# Altium footprint library MYLIB.PcbLib: 600 footprints (part 16 of 39)
Each footprint in its own frame and in the unit in brackets; x right, y up, seen from the top. Pads: shape width x height; smd on the part's side, far side on the other; paste and mask are expansions set on the pad; w line width, h text height; cw(c..) or ccw(c..) is an arc to the next point about the centre after c.
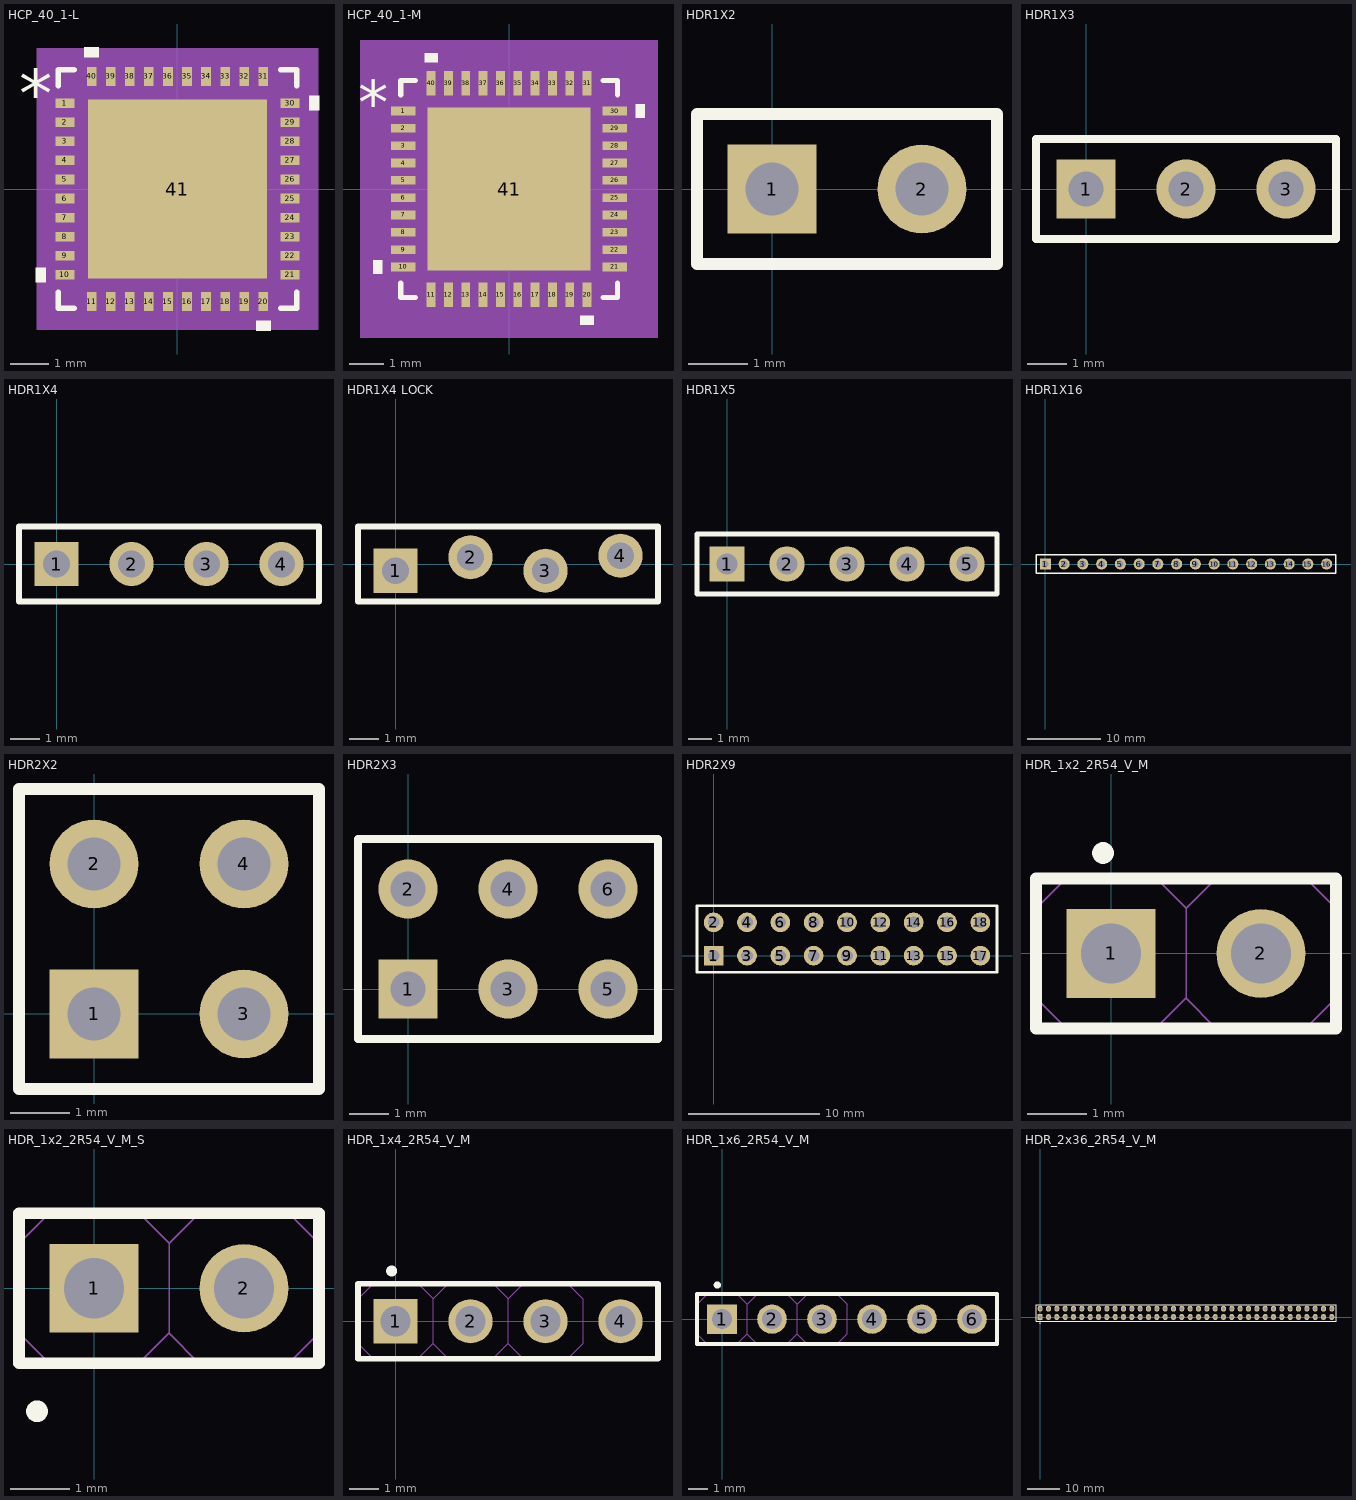
[diagram p15: the footprints below, top view; thin cyan lines are the x and y axes]

## HCP_40_1-L [mm]
pads (41):
  rect 0.503x0.254 smd paste+0 mask+0: 1(-2.952,2.25) 2(-2.952,1.75) 3(-2.952,1.25) 4(-2.952,0.75) 5(-2.952,0.25) 6(-2.952,-0.25) 7(-2.952,-0.75) 8(-2.952,-1.25) 9(-2.952,-1.75) 10(-2.952,-2.25) 21(2.952,-2.25) 22(2.952,-1.75) 23(2.952,-1.25) 24(2.952,-0.75) 25(2.952,-0.25) 26(2.952,0.25) 27(2.952,0.75) 28(2.952,1.25) 29(2.952,1.75) 30(2.952,2.25)
  rect 0.254x0.503 smd paste+0 mask+0: 11(-2.25,-2.952) 12(-1.75,-2.952) 13(-1.25,-2.952) 14(-0.75,-2.952) 15(-0.25,-2.952) 16(0.25,-2.952) 17(0.75,-2.952) 18(1.25,-2.952) 19(1.75,-2.952) 20(2.25,-2.952) 31(2.25,2.952) 32(1.75,2.952) 33(1.25,2.952) 34(0.75,2.952) 35(0.25,2.952) 36(-0.25,2.952) 37(-0.75,2.952) 38(-1.25,2.952) 39(-1.75,2.952) 40(-2.25,2.952)
  rect 4.7x4.7 smd paste-2.337 mask+0: 41(0,0)
Top Overlay:
  region: -3.457,-2.06 -3.711,-2.06 -3.711,-2.441 -3.457,-2.441
  region: 2.441,-3.457 2.06,-3.457 2.06,-3.711 2.441,-3.711
  region: 3.457,2.441 3.711,2.441 3.711,2.06 3.457,2.06
  region: -2.06,3.457 -2.441,3.457 -2.441,3.711 -2.06,3.711
  lines w0.152: -3.127,-2.71 -3.127,-3.127 -2.71,-3.127 ; -3.127,2.71 -3.127,3.127 -2.71,3.127 ; 2.71,-3.127 3.127,-3.127 3.127,-2.71 ; 2.71,3.127 3.127,3.127 3.127,2.71
  text "*" at -4.156,1.865 h1.27
Top Paste:
  region: -0.883,2.25 -2.25,2.25 -2.25,0.883 -0.883,0.883
  region: -0.883,0.683 -2.25,0.683 -2.25,-0.683 -0.883,-0.683
  region: -0.883,-0.883 -2.25,-0.883 -2.25,-2.25 -0.883,-2.25
  region: 0.683,2.25 -0.683,2.25 -0.683,0.883 0.683,0.883
  region: 0.683,0.683 -0.683,0.683 -0.683,-0.683 0.683,-0.683
  region: 0.683,-0.883 -0.683,-0.883 -0.683,-2.25 0.683,-2.25
  region: 2.25,2.25 0.883,2.25 0.883,0.883 2.25,0.883
  region: 2.25,0.683 0.883,0.683 0.883,-0.683 2.25,-0.683
  region: 2.25,-0.883 0.883,-0.883 0.883,-2.25 2.25,-2.25
Mechanical 5:
  region: 3.686,-3.686 -3.686,-3.686 -3.686,3.686 3.686,3.686
Mechanical 13:
  lines w0.025: -3,1.73 -1.73,3 ; -3,-3 3,-3 3,3 -3,3 -3,-3 ; -3,-2.402 -3,-2.098 -3,-2.402 ; -3,-1.902 -3,-1.598 -3,-1.902 ; -3,-1.402 -3,-1.098 -3,-1.402 ; -3,-0.902 -3,-0.598 -3,-0.902 ; -3,-0.402 -3,-0.098 -3,-0.402 ; -3,0.098 -3,0.402 -3,0.098 ; -3,0.598 -3,0.902 -3,0.598 ; -3,1.098 -3,1.402 -3,1.098 ; -3,1.598 -3,1.902 -3,1.598 ; -3,2.098 -3,2.402 -3,2.098 ; -2.402,-3 -2.098,-3 -2.402,-3 ; -2.402,3 -2.098,3 -2.402,3 ; -1.902,-3 -1.598,-3 -1.902,-3 ; -1.902,3 -1.598,3 -1.902,3 ; -1.402,-3 -1.098,-3 -1.402,-3 ; -1.402,3 -1.098,3 -1.402,3 ; -0.902,-3 -0.598,-3 -0.902,-3 ; -0.902,3 -0.598,3 -0.902,3 ; -0.402,-3 -0.098,-3 -0.402,-3 ; -0.402,3 -0.098,3 -0.402,3 ; 0.098,-3 0.402,-3 0.098,-3 ; 0.098,3 0.402,3 0.098,3 ; 0.598,-3 0.902,-3 0.598,-3 ; 0.598,3 0.902,3 0.598,3 ; 1.098,-3 1.402,-3 1.098,-3 ; 1.098,3 1.402,3 1.098,3 ; 1.598,-3 1.902,-3 1.598,-3 ; 1.598,3 1.902,3 1.598,3 ; 2.098,-3 2.402,-3 2.098,-3 ; 2.098,3 2.402,3 2.098,3 ; 3,-2.402 3,-2.098 3,-2.402 ; 3,-1.902 3,-1.598 3,-1.902 ; 3,-1.402 3,-1.098 3,-1.402 ; 3,-0.902 3,-0.598 3,-0.902 ; 3,-0.402 3,-0.098 3,-0.402 ; 3,0.098 3,0.402 3,0.098 ; 3,0.598 3,0.902 3,0.598 ; 3,1.098 3,1.402 3,1.098 ; 3,1.598 3,1.902 3,1.598 ; 3,2.098 3,2.402 3,2.098
  text "*" at -3.017,1.865 h1.27
Mechanical 15:
  region: -2.479,-3.102 -3.102,-3.102 -3.102,-2.479 -3.305,-2.479 -3.305,2.479 -3.102,2.479 -3.102,3.102 -2.479,3.102 -2.479,3.305 2.479,3.305 2.479,3.102 3.102,3.102 3.102,2.479 3.305,2.479 3.305,-2.479 3.102,-2.479 3.102,-3.102 2.479,-3.102 2.479,-3.305 -2.479,-3.305
  lines w0.152: -3.305,-2.479 -3.102,-2.479 -3.102,-3.102 -2.479,-3.102 -2.479,-3.305 2.479,-3.305 2.479,-3.102 3.102,-3.102 3.102,-2.479 3.305,-2.479 3.305,2.479 3.102,2.479 3.102,3.102 2.479,3.102 2.479,3.305 -2.479,3.305 -2.479,3.102 -3.102,3.102 -3.102,2.479 -3.305,2.479 -3.305,-2.479
3D body: height 0.25, standoff 0, extent 0,0 0.254,0.254

## HCP_40_1-M [mm]
pads (41):
  rect 0.706x0.254 smd paste+0 mask+0: 1(-3.053,2.25) 2(-3.053,1.75) 3(-3.053,1.25) 4(-3.053,0.75) 5(-3.053,0.25) 6(-3.053,-0.25) 7(-3.053,-0.75) 8(-3.053,-1.25) 9(-3.053,-1.75) 10(-3.053,-2.25) 21(3.053,-2.25) 22(3.053,-1.75) 23(3.053,-1.25) 24(3.053,-0.75) 25(3.053,-0.25) 26(3.053,0.25) 27(3.053,0.75) 28(3.053,1.25) 29(3.053,1.75) 30(3.053,2.25)
  rect 0.254x0.706 smd paste+0 mask+0: 11(-2.25,-3.053) 12(-1.75,-3.053) 13(-1.25,-3.053) 14(-0.75,-3.053) 15(-0.25,-3.053) 16(0.25,-3.053) 17(0.75,-3.053) 18(1.25,-3.053) 19(1.75,-3.053) 20(2.25,-3.053) 31(2.25,3.053) 32(1.75,3.053) 33(1.25,3.053) 34(0.75,3.053) 35(0.25,3.053) 36(-0.25,3.053) 37(-0.75,3.053) 38(-1.25,3.053) 39(-1.75,3.053) 40(-2.25,3.053)
  rect 4.7x4.7 smd paste-2.337 mask+0: 41(0,0)
Top Overlay:
  region: -3.66,-2.06 -3.914,-2.06 -3.914,-2.441 -3.66,-2.441
  region: 2.441,-3.66 2.06,-3.66 2.06,-3.914 2.441,-3.914
  region: 3.66,2.441 3.914,2.441 3.914,2.06 3.66,2.06
  region: -2.06,3.66 -2.441,3.66 -2.441,3.914 -2.06,3.914
  lines w0.152: -3.127,-2.71 -3.127,-3.127 -2.71,-3.127 ; -3.127,2.71 -3.127,3.127 -2.71,3.127 ; 2.71,-3.127 3.127,-3.127 3.127,-2.71 ; 2.71,3.127 3.127,3.127 3.127,2.71
  text "*" at -4.359,1.865 h1.27
Top Paste:
  region: -0.883,2.25 -2.25,2.25 -2.25,0.883 -0.883,0.883
  region: -0.883,0.683 -2.25,0.683 -2.25,-0.683 -0.883,-0.683
  region: -0.883,-0.883 -2.25,-0.883 -2.25,-2.25 -0.883,-2.25
  region: 0.683,2.25 -0.683,2.25 -0.683,0.883 0.683,0.883
  region: 0.683,0.683 -0.683,0.683 -0.683,-0.683 0.683,-0.683
  region: 0.683,-0.883 -0.683,-0.883 -0.683,-2.25 0.683,-2.25
  region: 2.25,2.25 0.883,2.25 0.883,0.883 2.25,0.883
  region: 2.25,0.683 0.883,0.683 0.883,-0.683 2.25,-0.683
  region: 2.25,-0.883 0.883,-0.883 0.883,-2.25 2.25,-2.25
Mechanical 5:
  region: 4.295,-4.295 -4.295,-4.295 -4.295,4.295 4.295,4.295
Mechanical 13:
  lines w0.025: -3,1.73 -1.73,3 ; -3,-3 3,-3 3,3 -3,3 -3,-3 ; -3,-2.402 -3,-2.098 -3,-2.402 ; -3,-1.902 -3,-1.598 -3,-1.902 ; -3,-1.402 -3,-1.098 -3,-1.402 ; -3,-0.902 -3,-0.598 -3,-0.902 ; -3,-0.402 -3,-0.098 -3,-0.402 ; -3,0.098 -3,0.402 -3,0.098 ; -3,0.598 -3,0.902 -3,0.598 ; -3,1.098 -3,1.402 -3,1.098 ; -3,1.598 -3,1.902 -3,1.598 ; -3,2.098 -3,2.402 -3,2.098 ; -2.402,-3 -2.098,-3 -2.402,-3 ; -2.402,3 -2.098,3 -2.402,3 ; -1.902,-3 -1.598,-3 -1.902,-3 ; -1.902,3 -1.598,3 -1.902,3 ; -1.402,-3 -1.098,-3 -1.402,-3 ; -1.402,3 -1.098,3 -1.402,3 ; -0.902,-3 -0.598,-3 -0.902,-3 ; -0.902,3 -0.598,3 -0.902,3 ; -0.402,-3 -0.098,-3 -0.402,-3 ; -0.402,3 -0.098,3 -0.402,3 ; 0.098,-3 0.402,-3 0.098,-3 ; 0.098,3 0.402,3 0.098,3 ; 0.598,-3 0.902,-3 0.598,-3 ; 0.598,3 0.902,3 0.598,3 ; 1.098,-3 1.402,-3 1.098,-3 ; 1.098,3 1.402,3 1.098,3 ; 1.598,-3 1.902,-3 1.598,-3 ; 1.598,3 1.902,3 1.598,3 ; 2.098,-3 2.402,-3 2.098,-3 ; 2.098,3 2.402,3 2.098,3 ; 3,-2.402 3,-2.098 3,-2.402 ; 3,-1.902 3,-1.598 3,-1.902 ; 3,-1.402 3,-1.098 3,-1.402 ; 3,-0.902 3,-0.598 3,-0.902 ; 3,-0.402 3,-0.098 3,-0.402 ; 3,0.098 3,0.402 3,0.098 ; 3,0.598 3,0.902 3,0.598 ; 3,1.098 3,1.402 3,1.098 ; 3,1.598 3,1.902 3,1.598 ; 3,2.098 3,2.402 3,2.098
  text "*" at -3.017,1.865 h1.27
Mechanical 15:
  region: -2.885,-3.508 -3.508,-3.508 -3.508,-2.885 -3.914,-2.885 -3.914,2.885 -3.508,2.885 -3.508,3.508 -2.885,3.508 -2.885,3.914 2.885,3.914 2.885,3.508 3.508,3.508 3.508,2.885 3.914,2.885 3.914,-2.885 3.508,-2.885 3.508,-3.508 2.885,-3.508 2.885,-3.914 -2.885,-3.914
  lines w0.152: -3.914,-2.885 -3.508,-2.885 -3.508,-3.508 -2.885,-3.508 -2.885,-3.914 2.885,-3.914 2.885,-3.508 3.508,-3.508 3.508,-2.885 3.914,-2.885 3.914,2.885 3.508,2.885 3.508,3.508 2.885,3.508 2.885,3.914 -2.885,3.914 -2.885,3.508 -3.508,3.508 -3.508,2.885 -3.914,2.885 -3.914,-2.885
3D body: height 0.25, standoff 0, extent 0,0 0.254,0.254

## HDR1X2 [mm]
pads (2):
  rect 1.5x1.5 hole 0.9: 1(0,0)
  round 1.5 hole 0.9: 2(2.54,0)
Top Overlay:
  lines w0.2: -1.27,-1.27 3.81,-1.27 3.81,1.27 -1.27,1.27 -1.27,-1.27

## HDR1X3 [mm]
pads (3):
  rect 1.5x1.5 hole 0.9: 1(0,0)
  round 1.5 hole 0.9: 2(2.54,0) 3(5.08,0)
Top Overlay:
  lines w0.2: -1.27,-1.27 -1.27,1.27 6.35,1.27 6.35,-1.27 -1.27,-1.27

## HDR1X4 [mm]
pads (4):
  rect 1.5x1.5 hole 0.9: 1(0,0)
  round 1.5 hole 0.9: 2(2.54,0) 3(5.08,0) 4(7.62,0)
Top Overlay:
  lines w0.2: -1.27,-1.27 8.89,-1.27 8.89,1.27 -1.27,1.27 -1.27,-1.27

## HDR1X4 LOCK [mm]
pads (4):
  rect 1.5x1.5 hole 0.9: 1(0,-0.229)
  round 1.5 hole 0.9: 2(2.54,0.229) 3(5.08,-0.229) 4(7.62,0.279)
Top Overlay:
  lines w0.2: -1.27,-1.27 -1.27,1.27 8.89,1.27 8.89,-1.27 -1.27,-1.27

## HDR1X5 [mm]
pads (5):
  rect 1.5x1.5 hole 0.9: 1(0,0)
  round 1.5 hole 0.9: 2(2.54,0) 3(5.08,0) 4(7.62,0) 5(10.16,0)
Top Overlay:
  lines w0.2: -1.27,-1.27 -1.27,1.27 11.43,1.27 11.43,-1.27 -1.27,-1.27

## HDR1X16 [mm]
pads (16):
  rect 1.5x1.5 hole 0.9: 1(0,0)
  round 1.5 hole 0.9: 2(2.54,0) 3(5.08,0) 4(7.62,0) 5(10.16,0) 6(12.7,0) 7(15.24,0) 8(17.78,0) 9(20.32,0) 10(22.86,0) 11(25.4,0) 12(27.94,0) 13(30.48,0) 14(33.02,0) 15(35.56,0) 16(38.1,0)
Top Overlay:
  lines w0.2: -1.27,-1.27 -1.27,1.27 0.635,1.27 39.37,1.27 39.37,-1.27 -1.27,-1.27

## HDR2X2 [mm]
pads (4):
  rect 1.5x1.5 hole 0.9: 1(0,0)
  round 1.5 hole 0.9: 2(0,2.54) 3(2.54,0) 4(2.54,2.54)
Top Overlay:
  lines w0.2: -1.27,-1.27 -1.27,3.81 3.81,3.81 3.81,-1.27 -1.27,-1.27

## HDR2X3 [mm]
pads (6):
  rect 1.5x1.5 hole 0.9: 1(0,0)
  round 1.5 hole 0.9: 2(0,2.54) 3(2.54,0) 4(2.54,2.54) 5(5.08,0) 6(5.08,2.54)
Top Overlay:
  lines w0.2: 1.482,-1.27 6.35,-1.27 ; 6.35,-1.27 -1.27,-1.27 -1.27,3.81 6.35,3.81 6.35,-1.27

## HDR2X9 [mm]
pads (18):
  rect 1.5x1.5 hole 0.9: 1(0,0)
  round 1.5 hole 0.9: 2(0,2.54) 3(2.54,0) 4(2.54,2.54) 5(5.08,0) 6(5.08,2.54) 7(7.62,0) 8(7.62,2.54) 9(10.16,0) 10(10.16,2.54) 11(12.7,0) 12(12.7,2.54) 13(15.24,0) 14(15.24,2.54) 15(17.78,0) 16(17.78,2.54) 17(20.32,0) 18(20.32,2.54)
Top Overlay:
  lines w0.2: -1.27,-1.27 21.59,-1.27 21.59,3.81 -1.27,3.81 -1.27,-1.27

## HDR_1x2_2R54_V_M [mm] "Male Header, Pitch 2.54mm, 4x1 Position, Mated Height 6mm, Tail Length 3mm"
height 6
pads (2):
  rect 1.5x1.5 hole 1.02: 1(0,0)
  round 1.5 hole 1.02: 2(2.54,0)
Top Overlay:
  circle w0.25: c-0.135,1.702 r0.059
  lines w0.2: -1.27,-1.27 -1.27,1.27 3.81,1.27 3.81,-1.27 -1.27,-1.27
Mechanical 13:
  lines w0.025: 3.81,-0.762 3.302,-1.27 ; 3.81,0.762 3.302,1.27 1.778,1.27 1.27,0.762 ; -1.27,-0.762 -1.27,0.762 ; -1.27,-0.762 -1.27,0.762 ; -1.27,-0.762 -0.762,-1.27 ; -1.27,0.762 -0.762,1.27 0.762,1.27 1.27,0.762 ; -0.762,-1.27 0.762,-1.27 ; -0.762,-1.27 0.762,-1.27 ; 0.762,-1.27 1.27,-0.762 ; 1.27,-0.762 1.27,0.762 ; 1.27,-0.762 1.27,0.762 ; 1.27,-0.762 1.27,0.762 ; 1.27,-0.762 1.27,0.762 ; 1.27,-0.762 1.778,-1.27 ; 1.778,-1.27 3.302,-1.27 ; 1.778,-1.27 3.302,-1.27
3D body: height 2.54, standoff 0, extent -1.27,-1.27 1.27,1.27
3D body: height 9, standoff -10, extent -0.35,-0.349 0.347,0.349
3D body: height 2.54, standoff 0, extent 1.27,-1.27 3.81,1.27
3D body: height 9, standoff -10, extent 2.19,-0.349 2.887,0.349

## HDR_1x2_2R54_V_M_S [mm] "Male Header, Pitch 2.54mm, 4x1 Position, Mated Height 6mm, Tail Length 3mm"
height 6
pads (2):
  rect 1.5x1.5 hole 1.02: 1(0,0)
  round 1.5 hole 1.02: 2(2.54,0)
Top Overlay:
  circle w0.25: c-0.965,-2.083 r0.059
  lines w0.2: -1.27,-1.27 3.81,-1.27 3.81,1.27 -1.27,1.27 -1.27,-1.27
Mechanical 13:
  lines w0.025: 3.81,-0.762 3.302,-1.27 ; 3.81,0.762 3.302,1.27 1.778,1.27 1.27,0.762 ; -1.27,-0.762 -0.762,-1.27 ; -1.27,-0.762 -1.27,0.762 ; -1.27,-0.762 -1.27,0.762 ; -1.27,0.762 -0.762,1.27 0.762,1.27 1.27,0.762 ; -0.762,-1.27 0.762,-1.27 ; -0.762,-1.27 0.762,-1.27 ; 0.762,-1.27 1.27,-0.762 ; 1.27,-0.762 1.778,-1.27 ; 1.27,-0.762 1.27,0.762 ; 1.27,-0.762 1.27,0.762 ; 1.27,-0.762 1.27,0.762 ; 1.27,-0.762 1.27,0.762 ; 1.778,-1.27 3.302,-1.27 ; 1.778,-1.27 3.302,-1.27
3D body: height 9, standoff -3, extent 2.19,-0.349 2.887,0.349
3D body: height 2.54, standoff 0, extent 1.27,-1.27 3.81,1.27
3D body: height 9, standoff -3, extent -0.35,-0.349 0.347,0.349
3D body: height 2.54, standoff 0, extent -1.27,-1.27 1.27,1.27

## HDR_1x4_2R54_V_M [mm] "Male Header, Pitch 2.54mm, 4x1 Position, Mated Height 6mm, Tail Length 3mm"
height 6
pads (4):
  rect 1.5x1.5 hole 1.02: 1(0,0)
  round 1.5 hole 1.02: 2(2.54,0) 3(5.08,0) 4(7.62,0)
Top Overlay:
  circle w0.25: c-0.135,1.702 r0.059
  lines w0.2: 8.865,1.27 -1.27,1.27 -1.27,-1.27 8.89,-1.27 8.89,1.27
Mechanical 13:
  lines w0.025: -1.27,-0.762 -0.762,-1.27 ; -1.27,-0.762 -1.27,0.762 ; -1.27,-0.762 -1.27,0.762 ; -1.27,0.762 -0.762,1.27 0.762,1.27 1.27,0.762 ; -0.762,-1.27 0.762,-1.27 ; -0.762,-1.27 0.762,-1.27 ; 0.762,-1.27 1.27,-0.762 ; 1.27,-0.762 1.778,-1.27 ; 1.27,-0.762 1.27,0.762 ; 1.27,-0.762 1.27,0.762 ; 1.27,-0.762 1.27,0.762 ; 1.27,-0.762 1.27,0.762 ; 1.27,0.762 1.778,1.27 3.302,1.27 3.81,0.762 ; 1.778,-1.27 3.302,-1.27 ; 1.778,-1.27 3.302,-1.27 ; 3.302,-1.27 3.81,-0.762 ; 3.81,-0.762 4.318,-1.27 ; 3.81,-0.762 3.81,0.762 ; 3.81,-0.762 3.81,0.762 ; 3.81,-0.762 3.81,0.762 ; 3.81,-0.762 3.81,0.762 ; 3.81,0.762 4.318,1.27 5.842,1.27 6.35,0.762 ; 4.318,-1.27 5.842,-1.27 ; 4.318,-1.27 5.842,-1.27 ; 5.842,-1.27 6.35,-0.762 ; 6.35,-0.762 6.35,0.762 ; 6.35,-0.762 6.35,0.762
3D body: height 2.54, standoff 0, extent 6.35,-1.27 8.89,1.27
3D body: height 9, standoff -2.54, extent 7.27,-0.349 7.967,0.349
3D body: height 9, standoff -2.54, extent 4.73,-0.349 5.427,0.349
3D body: height 2.54, standoff 0, extent 3.81,-1.27 6.35,1.27
3D body: height 9, standoff -2.54, extent 2.19,-0.349 2.887,0.349
3D body: height 2.54, standoff 0, extent 1.27,-1.27 3.81,1.27
3D body: height 9, standoff -2.54, extent -0.35,-0.349 0.347,0.349
3D body: height 2.54, standoff 0, extent -1.27,-1.27 1.27,1.27

## HDR_1x6_2R54_V_M [mm] "Male Header, Pitch 2.54mm, 6x1 Position, Mated Height 6mm, Tail Length 3mm"
height 6
pads (6):
  rect 1.5x1.5 hole 1.02: 1(0,0)
  round 1.5 hole 1.02: 2(2.54,0) 3(5.08,0) 4(7.62,0) 5(10.16,0) 6(12.7,0)
Top Overlay:
  circle w0.25: c-0.236,1.727 r0.059
  lines w0.2: 13.945,-1.27 -1.27,-1.27 -1.27,1.27 13.945,1.27 ; 13.97,-1.27 13.97,1.27
Mechanical 13:
  lines w0.025: -1.27,-0.762 -0.762,-1.27 ; -1.27,-0.762 -1.27,0.762 ; -1.27,-0.762 -1.27,0.762 ; -1.27,0.762 -0.762,1.27 0.762,1.27 1.27,0.762 ; -0.762,-1.27 0.762,-1.27 ; -0.762,-1.27 0.762,-1.27 ; 0.762,-1.27 1.27,-0.762 ; 1.27,-0.762 1.778,-1.27 ; 1.27,-0.762 1.27,0.762 ; 1.27,-0.762 1.27,0.762 ; 1.27,-0.762 1.27,0.762 ; 1.27,-0.762 1.27,0.762 ; 1.27,0.762 1.778,1.27 3.302,1.27 3.81,0.762 ; 1.778,-1.27 3.302,-1.27 ; 1.778,-1.27 3.302,-1.27 ; 3.302,-1.27 3.81,-0.762 ; 3.81,-0.762 4.318,-1.27 ; 3.81,-0.762 3.81,0.762 ; 3.81,-0.762 3.81,0.762 ; 3.81,-0.762 3.81,0.762 ; 3.81,-0.762 3.81,0.762 ; 3.81,0.762 4.318,1.27 5.842,1.27 6.35,0.762 ; 4.318,-1.27 5.842,-1.27 ; 4.318,-1.27 5.842,-1.27 ; 5.842,-1.27 6.35,-0.762 ; 6.35,-0.762 6.35,0.762 ; 6.35,-0.762 6.35,0.762
3D body: height 2.54, standoff 0, extent 11.43,-1.27 13.97,1.27
3D body: height 9, standoff -2.54, extent 12.35,-0.349 13.047,0.349
3D body: height 2.54, standoff 0, extent 8.89,-1.27 11.43,1.27
3D body: height 9, standoff -2.54, extent 9.81,-0.349 10.507,0.349
3D body: height 2.54, standoff 0, extent 6.35,-1.27 8.89,1.27
3D body: height 9, standoff -2.54, extent 7.27,-0.349 7.967,0.349
3D body: height 9, standoff -2.54, extent 4.73,-0.349 5.427,0.349
3D body: height 2.54, standoff 0, extent 3.81,-1.27 6.35,1.27
3D body: height 9, standoff -2.54, extent 2.19,-0.349 2.887,0.349
3D body: height 2.54, standoff 0, extent 1.27,-1.27 3.81,1.27
3D body: height 9, standoff -2.54, extent -0.35,-0.349 0.347,0.349
3D body: height 2.54, standoff 0, extent -1.27,-1.27 1.27,1.27

## HDR_2x36_2R54_V_M [mm] "Male Header, Pitch 2.54mm, 36x2 Position, Mated Height 6mm, Tail Length 3mm"
height 6
pads (72):
  rect 1.5x1.8 hole 1.02: 1(0,0)
  oval 1.5x1.8 hole 1.02: 2(0,2.54) 3(2.54,0) 4(2.54,2.54) 5(5.08,0) 6(5.08,2.54) 7(7.62,0) 8(7.62,2.54) 9(10.16,0) 10(10.16,2.54) 11(12.7,0) 12(12.7,2.54) 13(15.24,0) 14(15.24,2.54) 15(17.78,0) 16(17.78,2.54) 17(20.32,0) 18(20.32,2.54) 19(22.86,0) 20(22.86,2.54) 21(25.4,0) 22(25.4,2.54) 23(27.94,0) 24(27.94,2.54) 25(30.48,0) 26(30.48,2.54) 27(33.02,0) 28(33.02,2.54) 29(35.56,0) 30(35.56,2.54) 31(38.1,0) 32(38.1,2.54) 33(40.64,0) 34(40.64,2.54) 35(43.18,0) 36(43.18,2.54) 37(45.72,0) 38(45.72,2.54) 39(48.26,0) 40(48.26,2.54) 41(50.8,0) 42(50.8,2.54) 43(53.34,0) 44(53.34,2.54) 45(55.88,0) 46(55.88,2.54) 47(58.42,0) 48(58.42,2.54) 49(60.96,0) 50(60.96,2.54) 51(63.5,0) 52(63.5,2.54) 53(66.04,0) 54(66.04,2.54) 55(68.58,0) 56(68.58,2.54) 57(71.12,0) 58(71.12,2.54) 59(73.66,0) 60(73.66,2.54) 61(76.2,0) 62(76.2,2.54) 63(78.74,0) 64(78.74,2.54) 65(81.28,0) 66(81.28,2.54) 67(83.82,0) 68(83.82,2.54) 69(86.36,0) 70(86.36,2.54) 71(88.9,0) 72(88.9,2.54)
Top Overlay:
  circle w0.25: c-0.059,-1.905 r0.059
  lines w0.127: -1.27,-1.27 -1.27,3.81 90.17,3.81 90.17,-1.27 -1.27,-1.27
3D body: height 2.54, standoff 0, extent -1.27,1.27 1.27,3.81
3D body: height 9, standoff -2.54, extent -0.35,2.191 0.347,2.889
3D body: height 2.54, standoff 0, extent 1.27,1.27 3.81,3.81
3D body: height 9, standoff -2.54, extent 2.19,2.191 2.887,2.889
3D body: height 2.54, standoff 0, extent 3.81,1.27 6.35,3.81
3D body: height 9, standoff -2.54, extent 4.73,2.191 5.427,2.889
3D body: height 9, standoff -2.54, extent 7.27,2.191 7.967,2.889
3D body: height 2.54, standoff 0, extent 6.35,1.27 8.89,3.81
3D body: height 9, standoff -2.54, extent 9.81,2.191 10.507,2.889
3D body: height 2.54, standoff 0, extent 8.89,1.27 11.43,3.81
3D body: height 9, standoff -2.54, extent 12.35,2.191 13.047,2.889
3D body: height 2.54, standoff 0, extent 11.43,1.27 13.97,3.81
3D body: height 2.54, standoff 0, extent 24.13,1.27 26.67,3.81
3D body: height 9, standoff -2.54, extent 25.05,2.191 25.747,2.889
3D body: height 2.54, standoff 0, extent 21.59,1.27 24.13,3.81
3D body: height 9, standoff -2.54, extent 22.51,2.191 23.207,2.889
3D body: height 2.54, standoff 0, extent 19.05,1.27 21.59,3.81
3D body: height 9, standoff -2.54, extent 19.97,2.191 20.667,2.889
3D body: height 9, standoff -2.54, extent 17.43,2.191 18.127,2.889
3D body: height 2.54, standoff 0, extent 16.51,1.27 19.05,3.81
3D body: height 9, standoff -2.54, extent 14.89,2.191 15.587,2.889
3D body: height 2.54, standoff 0, extent 13.97,1.27 16.51,3.81
3D body: height 2.54, standoff 0, extent 36.83,1.27 39.37,3.81
3D body: height 9, standoff -2.54, extent 37.75,2.191 38.447,2.889
3D body: height 2.54, standoff 0, extent 34.29,1.27 36.83,3.81
3D body: height 9, standoff -2.54, extent 35.21,2.191 35.907,2.889
3D body: height 2.54, standoff 0, extent 31.75,1.27 34.29,3.81
3D body: height 9, standoff -2.54, extent 32.67,2.191 33.367,2.889
3D body: height 9, standoff -2.54, extent 30.13,2.191 30.827,2.889
3D body: height 2.54, standoff 0, extent 29.21,1.27 31.75,3.81
3D body: height 9, standoff -2.54, extent 27.59,2.191 28.287,2.889
3D body: height 2.54, standoff 0, extent 26.67,1.27 29.21,3.81
3D body: height 2.54, standoff 0, extent 49.53,1.27 52.07,3.81
3D body: height 9, standoff -2.54, extent 50.45,2.191 51.147,2.889
3D body: height 2.54, standoff 0, extent 46.99,1.27 49.53,3.81
3D body: height 9, standoff -2.54, extent 47.91,2.191 48.607,2.889
3D body: height 2.54, standoff 0, extent 44.45,1.27 46.99,3.81
3D body: height 9, standoff -2.54, extent 45.37,2.191 46.067,2.889
3D body: height 9, standoff -2.54, extent 42.83,2.191 43.527,2.889
3D body: height 2.54, standoff 0, extent 41.91,1.27 44.45,3.81
3D body: height 9, standoff -2.54, extent 40.29,2.191 40.987,2.889
3D body: height 2.54, standoff 0, extent 39.37,1.27 41.91,3.81
3D body: height 2.54, standoff 0, extent 59.69,1.27 62.23,3.81
3D body: height 9, standoff -2.54, extent 60.61,2.191 61.307,2.889
3D body: height 2.54, standoff 0, extent 57.15,1.27 59.69,3.81
3D body: height 9, standoff -2.54, extent 58.07,2.191 58.767,2.889
3D body: height 9, standoff -2.54, extent 55.53,2.191 56.227,2.889
3D body: height 2.54, standoff 0, extent 54.61,1.27 57.15,3.81
3D body: height 9, standoff -2.54, extent 52.99,2.191 53.687,2.889
3D body: height 2.54, standoff 0, extent 52.07,1.27 54.61,3.81
3D body: height 2.54, standoff 0, extent 77.47,1.27 80.01,3.81
3D body: height 9, standoff -2.54, extent 78.39,2.191 79.087,2.889
3D body: height 2.54, standoff 0, extent 80.01,1.27 82.55,3.81
3D body: height 9, standoff -2.54, extent 80.93,2.191 81.627,2.889
3D body: height 9, standoff -2.54, extent 83.47,2.191 84.167,2.889
3D body: height 2.54, standoff 0, extent 82.55,1.27 85.09,3.81
3D body: height 9, standoff -2.54, extent 86.01,2.191 86.707,2.889
3D body: height 2.54, standoff 0, extent 85.09,1.27 87.63,3.81
3D body: height 2.54, standoff 0, extent 64.77,1.27 67.31,3.81
3D body: height 9, standoff -2.54, extent 65.69,2.191 66.387,2.889
3D body: height 2.54, standoff 0, extent 67.31,1.27 69.85,3.81
3D body: height 9, standoff -2.54, extent 68.23,2.191 68.927,2.889
3D body: height 9, standoff -2.54, extent 70.77,2.191 71.467,2.889
3D body: height 2.54, standoff 0, extent 69.85,1.27 72.39,3.81
3D body: height 9, standoff -2.54, extent 73.31,2.191 74.007,2.889
3D body: height 2.54, standoff 0, extent 72.39,1.27 74.93,3.81
3D body: height 9, standoff -2.54, extent 75.85,2.191 76.547,2.889
3D body: height 2.54, standoff 0, extent 74.93,1.27 77.47,3.81
3D body: height 9, standoff -2.54, extent 63.15,2.191 63.847,2.889
3D body: height 2.54, standoff 0, extent 62.23,1.27 64.77,3.81
3D body: height 9, standoff -2.54, extent -0.349,-0.347 0.349,0.35
3D body: height 2.54, standoff 0, extent -1.27,-1.27 1.27,1.27
3D body: height 2.54, standoff 0, extent 62.23,-1.27 64.77,1.27
3D body: height 9, standoff -2.54, extent 63.15,-0.349 63.847,0.349
3D body: height 2.54, standoff 0, extent 74.93,-1.27 77.47,1.27
3D body: height 9, standoff -2.54, extent 75.85,-0.349 76.547,0.349
3D body: height 2.54, standoff 0, extent 72.39,-1.27 74.93,1.27
3D body: height 9, standoff -2.54, extent 73.31,-0.349 74.007,0.349
3D body: height 2.54, standoff 0, extent 69.85,-1.27 72.39,1.27
3D body: height 9, standoff -2.54, extent 70.77,-0.349 71.467,0.349
3D body: height 9, standoff -2.54, extent 68.23,-0.349 68.927,0.349
3D body: height 2.54, standoff 0, extent 67.31,-1.27 69.85,1.27
3D body: height 9, standoff -2.54, extent 65.69,-0.349 66.387,0.349
3D body: height 2.54, standoff 0, extent 64.77,-1.27 67.31,1.27
3D body: height 2.54, standoff 0, extent 85.09,-1.27 87.63,1.27
3D body: height 9, standoff -2.54, extent 86.01,-0.349 86.707,0.349
3D body: height 2.54, standoff 0, extent 82.55,-1.27 85.09,1.27
3D body: height 9, standoff -2.54, extent 83.47,-0.349 84.167,0.349
3D body: height 9, standoff -2.54, extent 80.93,-0.349 81.627,0.349
3D body: height 2.54, standoff 0, extent 80.01,-1.27 82.55,1.27
3D body: height 9, standoff -2.54, extent 78.39,-0.349 79.087,0.349
3D body: height 2.54, standoff 0, extent 77.47,-1.27 80.01,1.27
3D body: height 2.54, standoff 0, extent 52.07,-1.27 54.61,1.27
3D body: height 9, standoff -2.54, extent 52.99,-0.349 53.687,0.349
3D body: height 2.54, standoff 0, extent 54.61,-1.27 57.15,1.27
3D body: height 9, standoff -2.54, extent 55.53,-0.349 56.227,0.349
3D body: height 9, standoff -2.54, extent 58.07,-0.349 58.767,0.349
3D body: height 2.54, standoff 0, extent 57.15,-1.27 59.69,1.27
3D body: height 9, standoff -2.54, extent 60.61,-0.349 61.307,0.349
3D body: height 2.54, standoff 0, extent 59.69,-1.27 62.23,1.27
3D body: height 2.54, standoff 0, extent 39.37,-1.27 41.91,1.27
3D body: height 9, standoff -2.54, extent 40.29,-0.349 40.987,0.349
3D body: height 2.54, standoff 0, extent 41.91,-1.27 44.45,1.27
3D body: height 9, standoff -2.54, extent 42.83,-0.349 43.527,0.349
3D body: height 9, standoff -2.54, extent 45.37,-0.349 46.067,0.349
3D body: height 2.54, standoff 0, extent 44.45,-1.27 46.99,1.27
3D body: height 9, standoff -2.54, extent 47.91,-0.349 48.607,0.349
3D body: height 2.54, standoff 0, extent 46.99,-1.27 49.53,1.27
3D body: height 9, standoff -2.54, extent 50.45,-0.349 51.147,0.349
3D body: height 2.54, standoff 0, extent 49.53,-1.27 52.07,1.27
3D body: height 2.54, standoff 0, extent 26.67,-1.27 29.21,1.27
3D body: height 9, standoff -2.54, extent 27.59,-0.349 28.287,0.349
3D body: height 2.54, standoff 0, extent 29.21,-1.27 31.75,1.27
3D body: height 9, standoff -2.54, extent 30.13,-0.349 30.827,0.349
3D body: height 9, standoff -2.54, extent 32.67,-0.349 33.367,0.349
3D body: height 2.54, standoff 0, extent 31.75,-1.27 34.29,1.27
3D body: height 9, standoff -2.54, extent 35.21,-0.349 35.907,0.349
3D body: height 2.54, standoff 0, extent 34.29,-1.27 36.83,1.27
3D body: height 9, standoff -2.54, extent 37.75,-0.349 38.447,0.349
3D body: height 2.54, standoff 0, extent 36.83,-1.27 39.37,1.27
3D body: height 2.54, standoff 0, extent 13.97,-1.27 16.51,1.27
3D body: height 9, standoff -2.54, extent 14.89,-0.349 15.587,0.349
3D body: height 2.54, standoff 0, extent 16.51,-1.27 19.05,1.27
3D body: height 9, standoff -2.54, extent 17.43,-0.349 18.127,0.349
3D body: height 9, standoff -2.54, extent 19.97,-0.349 20.667,0.349
3D body: height 2.54, standoff 0, extent 19.05,-1.27 21.59,1.27
3D body: height 9, standoff -2.54, extent 22.51,-0.349 23.207,0.349
3D body: height 2.54, standoff 0, extent 21.59,-1.27 24.13,1.27
3D body: height 9, standoff -2.54, extent 25.05,-0.349 25.747,0.349
3D body: height 2.54, standoff 0, extent 24.13,-1.27 26.67,1.27
3D body: height 2.54, standoff 0, extent 11.43,-1.27 13.97,1.27
3D body: height 9, standoff -2.54, extent 12.35,-0.349 13.047,0.349
3D body: height 2.54, standoff 0, extent 8.89,-1.27 11.43,1.27
3D body: height 9, standoff -2.54, extent 9.81,-0.349 10.507,0.349
3D body: height 2.54, standoff 0, extent 6.35,-1.27 8.89,1.27
3D body: height 9, standoff -2.54, extent 7.27,-0.349 7.967,0.349
3D body: height 9, standoff -2.54, extent 4.73,-0.349 5.427,0.349
3D body: height 2.54, standoff 0, extent 3.81,-1.27 6.35,1.27
3D body: height 9, standoff -2.54, extent 2.19,-0.349 2.887,0.349
3D body: height 2.54, standoff 0, extent 1.27,-1.27 3.81,1.27
3D body: height 9, standoff -2.54, extent 88.55,-0.349 89.247,0.349
3D body: height 2.54, standoff 0, extent 87.63,-1.27 90.17,1.27
3D body: height 2.54, standoff 0, extent 87.63,1.27 90.17,3.81
3D body: height 9, standoff -2.54, extent 88.55,2.191 89.247,2.889